# Altium footprint library 4.30-KF-5.08连接器.PcbLib: 153 footprints (part 7 of 10)
Each footprint in its own frame and in the unit in brackets; x right, y up, seen from the top. Pads: shape width x height; smd on the part's side, far side on the other; paste and mask are expansions set on the pad; w line width, h text height; cw(c..) or ccw(c..) is an arc to the next point about the centre after c.
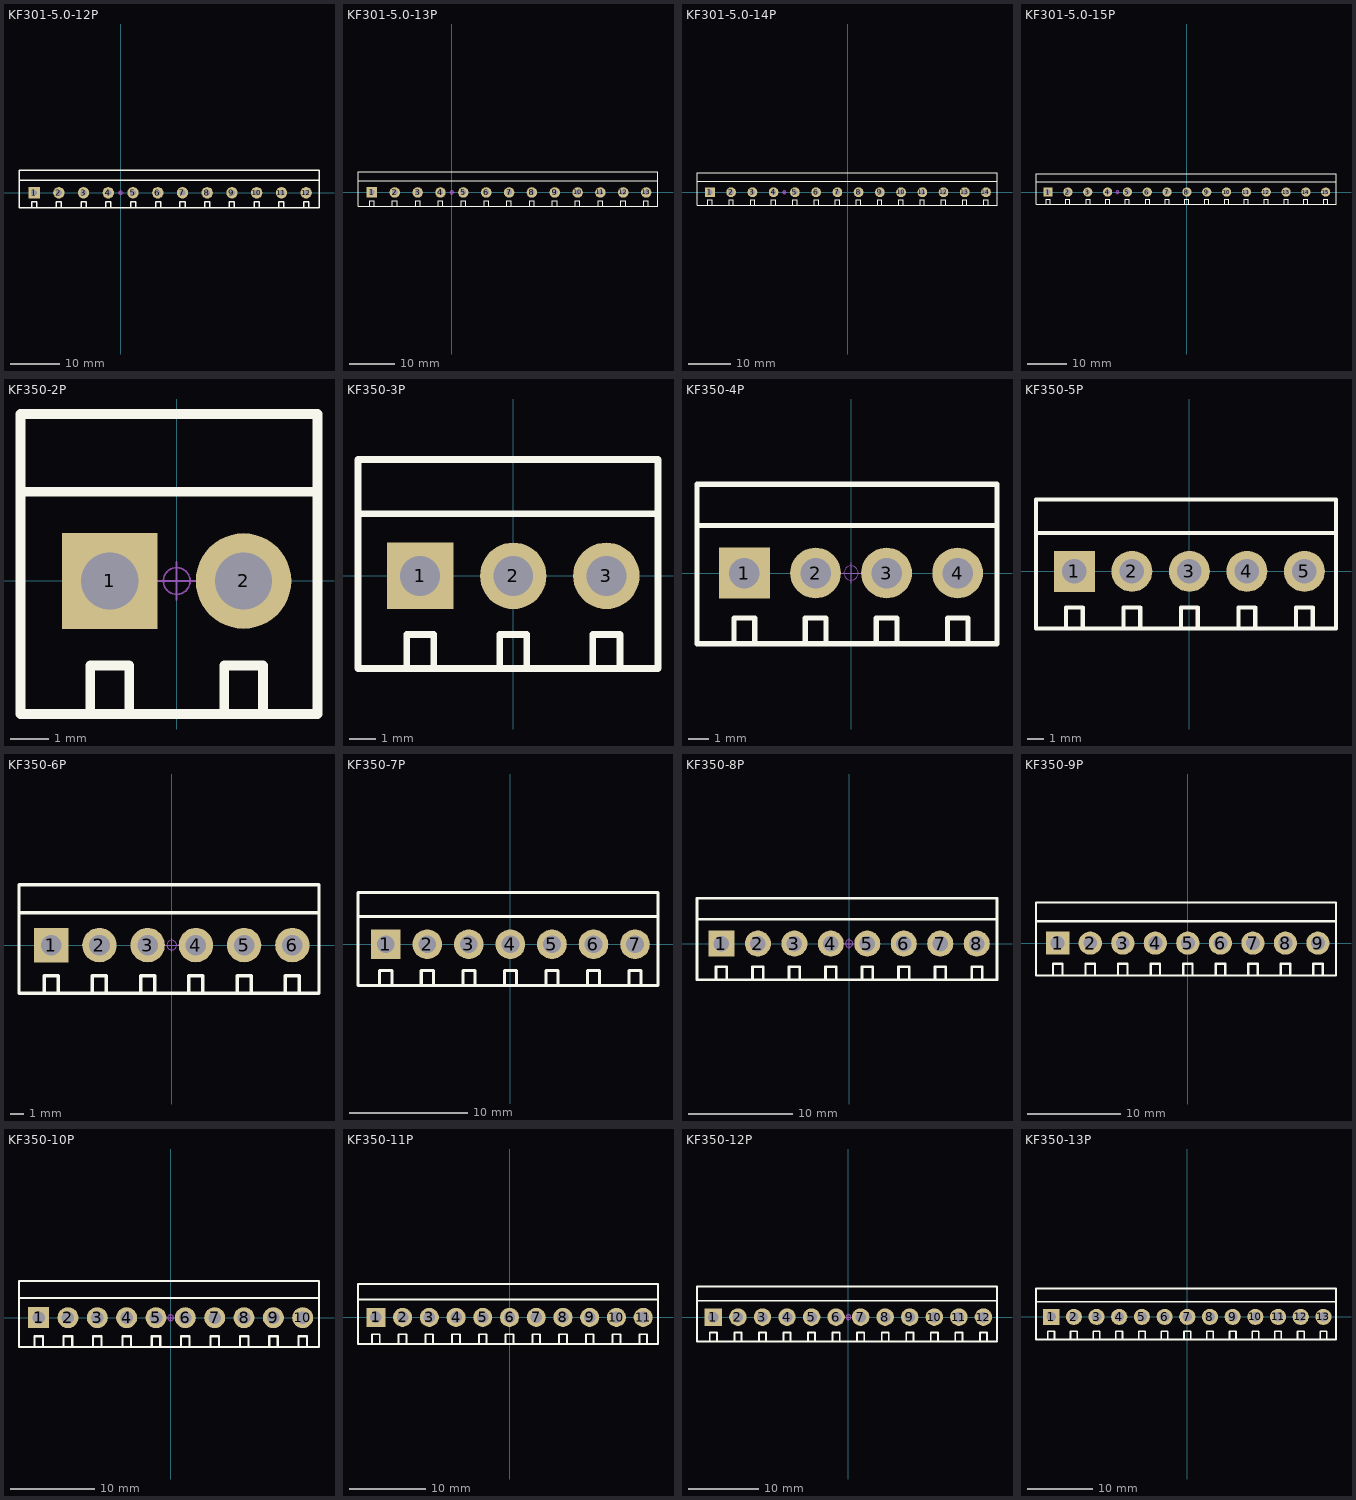
[diagram p6: the footprints below, top view; thin cyan lines are the x and y axes]

## KF301-5.0-12P [mm] "可拼接端子/6A      [ PCB学习群514746572 ]"
pads (12):
  rect 2.3x2.3 hole 1.2: 1(-17.5,0)
  round 2.3 hole 1.2: 2(-12.5,0) 3(-7.5,0) 4(-2.5,0) 5(2.5,0) 6(7.5,0) 7(12.5,0) 8(17.5,0) 9(22.5,0) 10(27.5,0) 11(32.5,0) 12(37.5,0)
Top Overlay:
  lines w0.254: -20.548,2.54 20.092,2.54 25.052,2.54 ; -18.008,-3.048 -18.008,-1.778 -16.992,-1.778 -16.992,-3.048 ; -13.008,-3.048 -13.008,-1.778 -11.992,-1.778 -11.992,-3.048 ; -7.928,-3.048 -7.928,-1.778 -6.912,-1.778 -6.912,-3.048 ; -3.008,-3.048 -3.008,-1.778 -1.992,-1.778 -1.992,-3.048 ; 1.992,-3.048 1.992,-1.778 3.008,-1.778 3.008,-3.048 ; 7.072,-3.048 7.072,-1.778 8.088,-1.778 8.088,-3.048 ; 11.992,-3.048 11.992,-1.778 13.008,-1.778 13.008,-3.048 ; 16.992,-3.048 16.992,-1.778 18.008,-1.778 18.008,-3.048 ; 21.992,-3.048 21.992,-1.778 23.008,-1.778 23.008,-3.048 ; 25.092,2.54 30.052,2.54 ; 26.992,-3.048 26.992,-1.778 28.008,-1.778 28.008,-3.048 ; 30.092,2.54 35.052,2.54 ; 31.992,-3.048 31.992,-1.778 33.008,-1.778 33.008,-3.048 ; 35.092,2.54 40.052,2.54 ; 36.992,-3.048 36.992,-1.778 38.008,-1.778 38.008,-3.048 ; -20.548,-3.048 -20.548,4.572 20.092,4.572 25.092,4.572 30.092,4.572 35.092,4.572 40.092,4.572 40.092,-3.048 35.092,-3.048 30.092,-3.048 25.092,-3.048 20.092,-3.048 -20.548,-3.048
Mechanical 15:
  circle w0.05: c0,0 r0.35
  lines w0.05: -0.5,0 0.5,0 ; 0,-0.5 0,0.5
3D body "KF301.STEP": height 3.29, standoff -10.51, extent -20.45,-3 -14.95,4.6
3D body "KF301.STEP": height 3.29, standoff -10.51, extent -15.45,-3 -9.95,4.6
3D body "KF301.STEP": height 3.29, standoff -10.51, extent -10.45,-3 -4.95,4.6
3D body "KF301.STEP": height 3.29, standoff -10.51, extent -5.45,-3 0.05,4.6
3D body "KF301.STEP": height 3.29, standoff -10.51, extent -0.45,-3 5.05,4.6
3D body "KF301.STEP": height 3.29, standoff -10.51, extent 4.55,-3 10.05,4.6
3D body "KF301.STEP": height 3.29, standoff -10.51, extent 9.55,-3 15.05,4.6
3D body "KF301.STEP": height 3.29, standoff -10.51, extent 14.55,-3 20.05,4.6
3D body "KF301.STEP": height 3.29, standoff -10.51, extent 19.55,-3 25.05,4.6
3D body "KF301.STEP": height 3.29, standoff -10.51, extent 24.55,-3 30.05,4.6
3D body "KF301.STEP": height 3.29, standoff -10.51, extent 29.55,-3 35.05,4.6
3D body "KF301.STEP": height 3.29, standoff -10.51, extent 34.55,-3 40.05,4.6

## KF301-5.0-13P [mm] "可拼接端子/6A      [ PCB学习群514746572 ]"
pads (13):
  rect 2.3x2.3 hole 1.2: 1(-17.5,0)
  round 2.3 hole 1.2: 2(-12.5,0) 3(-7.5,0) 4(-2.5,0) 5(2.5,0) 6(7.5,0) 7(12.5,0) 8(17.5,0) 9(22.5,0) 10(27.5,0) 11(32.5,0) 12(37.5,0) 13(42.5,0)
Top Overlay:
  lines w0.254: -20.548,2.54 20.092,2.54 25.052,2.54 ; -18.008,-3.048 -18.008,-1.778 -16.992,-1.778 -16.992,-3.048 ; -13.008,-3.048 -13.008,-1.778 -11.992,-1.778 -11.992,-3.048 ; -7.928,-3.048 -7.928,-1.778 -6.912,-1.778 -6.912,-3.048 ; -3.008,-3.048 -3.008,-1.778 -1.992,-1.778 -1.992,-3.048 ; 1.992,-3.048 1.992,-1.778 3.008,-1.778 3.008,-3.048 ; 7.072,-3.048 7.072,-1.778 8.088,-1.778 8.088,-3.048 ; 11.992,-3.048 11.992,-1.778 13.008,-1.778 13.008,-3.048 ; 16.992,-3.048 16.992,-1.778 18.008,-1.778 18.008,-3.048 ; 21.992,-3.048 21.992,-1.778 23.008,-1.778 23.008,-3.048 ; 25.092,2.54 30.052,2.54 ; 26.992,-3.048 26.992,-1.778 28.008,-1.778 28.008,-3.048 ; 30.092,2.54 35.052,2.54 ; 31.992,-3.048 31.992,-1.778 33.008,-1.778 33.008,-3.048 ; 35.092,2.54 40.052,2.54 ; 36.992,-3.048 36.992,-1.778 38.008,-1.778 38.008,-3.048 ; 40.092,2.54 45.052,2.54 ; 41.992,-3.048 41.992,-1.778 43.008,-1.778 43.008,-3.048 ; -20.548,-3.048 20.092,-3.048 25.092,-3.048 30.092,-3.048 35.092,-3.048 40.092,-3.048 45.092,-3.048 45.092,4.572 40.092,4.572 35.092,4.572 30.092,4.572 25.092,4.572 20.092,4.572 -20.548,4.572 -20.548,-3.048
Mechanical 15:
  circle w0.05: c0,0 r0.35
  lines w0.05: -0.5,0 0.5,0 ; 0,-0.5 0,0.5
3D body "KF301.STEP": height 3.29, standoff -10.51, extent -20.45,-3 -14.95,4.6
3D body "KF301.STEP": height 3.29, standoff -10.51, extent -15.45,-3 -9.95,4.6
3D body "KF301.STEP": height 3.29, standoff -10.51, extent -10.45,-3 -4.95,4.6
3D body "KF301.STEP": height 3.29, standoff -10.51, extent -5.45,-3 0.05,4.6
3D body "KF301.STEP": height 3.29, standoff -10.51, extent -0.45,-3 5.05,4.6
3D body "KF301.STEP": height 3.29, standoff -10.51, extent 4.55,-3 10.05,4.6
3D body "KF301.STEP": height 3.29, standoff -10.51, extent 9.55,-3 15.05,4.6
3D body "KF301.STEP": height 3.29, standoff -10.51, extent 14.55,-3 20.05,4.6
3D body "KF301.STEP": height 3.29, standoff -10.51, extent 19.55,-3 25.05,4.6
3D body "KF301.STEP": height 3.29, standoff -10.51, extent 24.55,-3 30.05,4.6
3D body "KF301.STEP": height 3.29, standoff -10.51, extent 29.55,-3 35.05,4.6
3D body "KF301.STEP": height 3.29, standoff -10.51, extent 34.55,-3 40.05,4.6
3D body "KF301.STEP": height 3.29, standoff -10.51, extent 39.55,-3 45.05,4.6

## KF301-5.0-14P [mm] "可拼接端子/6A      [ PCB学习群514746572 ]"
pads (14):
  rect 2.3x2.3 hole 1.2: 1(-32.5,0)
  round 2.3 hole 1.2: 2(-27.5,0) 3(-22.5,0) 4(-17.5,0) 5(-12.5,0) 6(-7.5,0) 7(-2.5,0) 8(2.5,0) 9(7.5,0) 10(12.5,0) 11(17.5,0) 12(22.5,0) 13(27.5,0) 14(32.5,0)
Top Overlay:
  lines w0.254: -35.548,2.54 5.092,2.54 10.052,2.54 ; -33.008,-3.048 -33.008,-1.778 -31.992,-1.778 -31.992,-3.048 ; -28.008,-3.048 -28.008,-1.778 -26.992,-1.778 -26.992,-3.048 ; -22.928,-3.048 -22.928,-1.778 -21.912,-1.778 -21.912,-3.048 ; -18.008,-3.048 -18.008,-1.778 -16.992,-1.778 -16.992,-3.048 ; -13.008,-3.048 -13.008,-1.778 -11.992,-1.778 -11.992,-3.048 ; -7.928,-3.048 -7.928,-1.778 -6.912,-1.778 -6.912,-3.048 ; -3.008,-3.048 -3.008,-1.778 -1.992,-1.778 -1.992,-3.048 ; 1.992,-3.048 1.992,-1.778 3.008,-1.778 3.008,-3.048 ; 6.992,-3.048 6.992,-1.778 8.008,-1.778 8.008,-3.048 ; 10.092,2.54 15.052,2.54 ; 11.992,-3.048 11.992,-1.778 13.008,-1.778 13.008,-3.048 ; 15.092,2.54 20.052,2.54 ; 16.992,-3.048 16.992,-1.778 18.008,-1.778 18.008,-3.048 ; 20.092,2.54 25.052,2.54 ; 21.992,-3.048 21.992,-1.778 23.008,-1.778 23.008,-3.048 ; 25.092,2.54 30.052,2.54 ; 26.992,-3.048 26.992,-1.778 28.008,-1.778 28.008,-3.048 ; 30.092,2.54 35.052,2.54 ; 31.992,-3.048 31.992,-1.778 33.008,-1.778 33.008,-3.048 ; -35.548,-3.048 -35.548,4.572 5.092,4.572 10.092,4.572 15.092,4.572 20.092,4.572 25.092,4.572 30.092,4.572 35.092,4.572 35.092,-3.048 30.092,-3.048 25.092,-3.048 20.092,-3.048 15.092,-3.048 10.092,-3.048 5.092,-3.048 -35.548,-3.048
Mechanical 15:
  circle w0.05: c-15,0 r0.35
  lines w0.05: -15.5,0 -14.5,0 ; -15,-0.5 -15,0.5
3D body "KF301.STEP": height 3.29, standoff -10.51, extent -35.45,-3 -29.95,4.6
3D body "KF301.STEP": height 3.29, standoff -10.51, extent -30.45,-3 -24.95,4.6
3D body "KF301.STEP": height 3.29, standoff -10.51, extent -25.45,-3 -19.95,4.6
3D body "KF301.STEP": height 3.29, standoff -10.51, extent -20.45,-3 -14.95,4.6
3D body "KF301.STEP": height 3.29, standoff -10.51, extent -15.45,-3 -9.95,4.6
3D body "KF301.STEP": height 3.29, standoff -10.51, extent -10.45,-3 -4.95,4.6
3D body "KF301.STEP": height 3.29, standoff -10.51, extent -5.45,-3 0.05,4.6
3D body "KF301.STEP": height 3.29, standoff -10.51, extent -0.45,-3 5.05,4.6
3D body "KF301.STEP": height 3.29, standoff -10.51, extent 4.55,-3 10.05,4.6
3D body "KF301.STEP": height 3.29, standoff -10.51, extent 9.55,-3 15.05,4.6
3D body "KF301.STEP": height 3.29, standoff -10.51, extent 14.55,-3 20.05,4.6
3D body "KF301.STEP": height 3.29, standoff -10.51, extent 19.55,-3 25.05,4.6
3D body "KF301.STEP": height 3.29, standoff -10.51, extent 24.55,-3 30.05,4.6
3D body "KF301.STEP": height 3.29, standoff -10.51, extent 29.55,-3 35.05,4.6

## KF301-5.0-15P [mm] "可拼接端子/6A      [ PCB学习群514746572 ]"
pads (15):
  rect 2.3x2.3 hole 1.2: 1(-35,0)
  round 2.3 hole 1.2: 2(-30,0) 3(-25,0) 4(-20,0) 5(-15,0) 6(-10,0) 7(-5,0) 8(0,0) 9(5,0) 10(10,0) 11(15,0) 12(20,0) 13(25,0) 14(30,0) 15(35,0)
Top Overlay:
  lines w0.254: -38.048,2.54 2.592,2.54 7.552,2.54 ; -35.508,-3.048 -35.508,-1.778 -34.492,-1.778 -34.492,-3.048 ; -30.508,-3.048 -30.508,-1.778 -29.492,-1.778 -29.492,-3.048 ; -25.428,-3.048 -25.428,-1.778 -24.412,-1.778 -24.412,-3.048 ; -20.508,-3.048 -20.508,-1.778 -19.492,-1.778 -19.492,-3.048 ; -15.508,-3.048 -15.508,-1.778 -14.492,-1.778 -14.492,-3.048 ; -10.428,-3.048 -10.428,-1.778 -9.412,-1.778 -9.412,-3.048 ; -5.508,-3.048 -5.508,-1.778 -4.492,-1.778 -4.492,-3.048 ; -0.508,-3.048 -0.508,-1.778 0.508,-1.778 0.508,-3.048 ; 4.492,-3.048 4.492,-1.778 5.508,-1.778 5.508,-3.048 ; 7.592,2.54 12.552,2.54 ; 9.492,-3.048 9.492,-1.778 10.508,-1.778 10.508,-3.048 ; 12.592,2.54 17.552,2.54 ; 14.492,-3.048 14.492,-1.778 15.508,-1.778 15.508,-3.048 ; 17.592,2.54 22.552,2.54 ; 19.492,-3.048 19.492,-1.778 20.508,-1.778 20.508,-3.048 ; 22.592,2.54 27.552,2.54 ; 24.492,-3.048 24.492,-1.778 25.508,-1.778 25.508,-3.048 ; 27.592,2.54 32.552,2.54 ; 29.492,-3.048 29.492,-1.778 30.508,-1.778 30.508,-3.048 ; 32.592,2.54 37.552,2.54 ; 34.492,-3.048 34.492,-1.778 35.508,-1.778 35.508,-3.048 ; -38.048,-3.048 -38.048,4.572 2.592,4.572 7.592,4.572 12.592,4.572 17.592,4.572 22.592,4.572 27.592,4.572 32.592,4.572 37.592,4.572 37.592,-3.048 32.592,-3.048 27.592,-3.048 22.592,-3.048 17.592,-3.048 12.592,-3.048 7.592,-3.048 2.592,-3.048 -38.048,-3.048
Mechanical 15:
  circle w0.05: c-17.5,0 r0.35
  lines w0.05: -18,0 -17,0 ; -17.5,-0.5 -17.5,0.5
3D body "KF301.STEP": height 3.29, standoff -10.51, extent 32.05,-3 37.55,4.6
3D body "KF301.STEP": height 3.29, standoff -10.51, extent 27.05,-3 32.55,4.6
3D body "KF301.STEP": height 3.29, standoff -10.51, extent 22.05,-3 27.55,4.6
3D body "KF301.STEP": height 3.29, standoff -10.51, extent 17.05,-3 22.55,4.6
3D body "KF301.STEP": height 3.29, standoff -10.51, extent 12.05,-3 17.55,4.6
3D body "KF301.STEP": height 3.29, standoff -10.51, extent 7.05,-3 12.55,4.6
3D body "KF301.STEP": height 3.29, standoff -10.51, extent 2.05,-3 7.55,4.6
3D body "KF301.STEP": height 3.29, standoff -10.51, extent -2.95,-3 2.55,4.6
3D body "KF301.STEP": height 3.29, standoff -10.51, extent -7.95,-3 -2.45,4.6
3D body "KF301.STEP": height 3.29, standoff -10.51, extent -12.95,-3 -7.45,4.6
3D body "KF301.STEP": height 3.29, standoff -10.51, extent -17.95,-3 -12.45,4.6
3D body "KF301.STEP": height 3.29, standoff -10.51, extent -22.95,-3 -17.45,4.6
3D body "KF301.STEP": height 3.29, standoff -10.51, extent -27.95,-3 -22.45,4.6
3D body "KF301.STEP": height 3.29, standoff -10.51, extent -32.95,-3 -27.45,4.6
3D body "KF301.STEP": height 3.29, standoff -10.51, extent -37.95,-3 -32.45,4.6

## KF350-2P [mm] "可拼接端子/10A      [ PCB学习群514746572 ]"
pads (2):
  rect 2.5x2.5 hole 1.5: 1(-1.75,0)
  round 2.5 hole 1.5: 2(1.75,0)
Top Overlay:
  lines w0.254: -4.087,2.337 3.686,2.337 ; -2.258,-3.48 -2.258,-2.21 -1.242,-2.21 -1.242,-3.48 ; 1.242,-3.48 1.242,-2.21 2.258,-2.21 2.258,-3.48 ; -4.087,-3.48 -4.087,4.369 3.686,4.369 3.686,-3.48 -4.087,-3.48
Mechanical 15:
  circle w0.05: c0,0 r0.35
  lines w0.05: -0.5,0 0.5,0 ; 0,-0.5 0,0.5
3D body "KF350.STEP": height 10.1, standoff -3.7, extent -0.4,-3.3 3.5,4.2
3D body "KF350.STEP": height 10.1, standoff -3.7, extent -3.9,-3.3 0,4.2

## KF350-3P [mm] "可拼接端子/10A      [ PCB学习群514746572 ]"
pads (3):
  rect 2.5x2.5 hole 1.5: 1(-3.5,0)
  round 2.5 hole 1.5: 2(0,0) 3(3.5,0)
Top Overlay:
  lines w0.254: -5.837,2.337 5.441,2.337 ; -4.008,-3.48 -4.008,-2.21 -2.992,-2.21 -2.992,-3.48 ; -0.508,-3.48 -0.508,-2.21 0.508,-2.21 0.508,-3.48 ; 2.992,-3.48 2.992,-2.21 4.008,-2.21 4.008,-3.48 ; -5.837,-3.48 5.441,-3.48 5.441,4.369 -5.837,4.369 -5.837,-3.48
Mechanical 15:
  circle w0.05: c0,0 r0.35
  lines w0.05: -0.5,0 0.5,0 ; 0,-0.5 0,0.5
3D body "KF350.STEP": height 10.1, standoff -3.7, extent -5.65,-3.3 -1.75,4.2
3D body "KF350.STEP": height 10.1, standoff -3.7, extent -2.15,-3.3 1.75,4.2
3D body "KF350.STEP": height 10.1, standoff -3.7, extent 1.35,-3.3 5.25,4.2

## KF350-4P [mm] "可拼接端子/10A      [ PCB学习群514746572 ]"
pads (4):
  rect 2.5x2.5 hole 1.5: 1(-5.25,0)
  round 2.5 hole 1.5: 2(-1.75,0) 3(1.75,0) 4(5.25,0)
Top Overlay:
  lines w0.254: -7.587,2.337 7.186,2.337 ; -5.758,-3.48 -5.758,-2.21 -4.742,-2.21 -4.742,-3.48 ; -2.258,-3.48 -2.258,-2.21 -1.242,-2.21 -1.242,-3.48 ; 1.242,-3.48 1.242,-2.21 2.258,-2.21 2.258,-3.48 ; 4.742,-3.48 4.742,-2.21 5.758,-2.21 5.758,-3.48 ; -7.587,-3.48 7.186,-3.48 7.186,4.369 -7.587,4.369 -7.587,-3.48
Mechanical 15:
  circle w0.05: c0,0 r0.35
  lines w0.05: -0.5,0 0.5,0 ; 0,-0.5 0,0.5
3D body "KF350.STEP": height 10.1, standoff -3.7, extent -7.4,-3.3 -3.5,4.2
3D body "KF350.STEP": height 10.1, standoff -3.7, extent -3.9,-3.3 0,4.2
3D body "KF350.STEP": height 10.1, standoff -3.7, extent -0.4,-3.3 3.5,4.2
3D body "KF350.STEP": height 10.1, standoff -3.7, extent 3.1,-3.3 7,4.2

## KF350-5P [mm] "可拼接端子/10A      [ PCB学习群514746572 ]"
pads (5):
  rect 2.5x2.5 hole 1.5: 1(-7,0)
  round 2.5 hole 1.5: 2(-3.5,0) 3(0,0) 4(3.5,0) 5(7,0)
Top Overlay:
  lines w0.254: -9.337,2.337 8.926,2.337 ; -7.508,-3.48 -7.508,-2.21 -6.492,-2.21 -6.492,-3.48 ; -4.008,-3.48 -4.008,-2.21 -2.992,-2.21 -2.992,-3.48 ; -0.508,-3.48 -0.508,-2.21 0.508,-2.21 0.508,-3.48 ; 2.992,-3.48 2.992,-2.21 4.008,-2.21 4.008,-3.48 ; 6.492,-3.48 6.492,-2.21 7.508,-2.21 7.508,-3.48 ; -9.337,-3.48 -9.337,4.369 8.926,4.369 8.926,-3.48 -9.337,-3.48
Mechanical 15:
  circle w0.05: c0,0 r0.35
  lines w0.05: -0.5,0 0.5,0 ; 0,-0.5 0,0.5
3D body "KF350.STEP": height 10.1, standoff -3.7, extent -9.15,-3.3 -5.25,4.2
3D body "KF350.STEP": height 10.1, standoff -3.7, extent -5.65,-3.3 -1.75,4.2
3D body "KF350.STEP": height 10.1, standoff -3.7, extent -2.15,-3.3 1.75,4.2
3D body "KF350.STEP": height 10.1, standoff -3.7, extent 1.35,-3.3 5.25,4.2
3D body "KF350.STEP": height 10.1, standoff -3.7, extent 4.85,-3.3 8.75,4.2

## KF350-6P [mm] "可拼接端子/10A      [ PCB学习群514746572 ]"
pads (6):
  rect 2.5x2.5 hole 1.5: 1(-8.75,0)
  round 2.5 hole 1.5: 2(-5.25,0) 3(-1.75,0) 4(1.75,0) 5(5.25,0) 6(8.75,0)
Top Overlay:
  lines w0.254: -11.087,2.337 10.66,2.337 ; -9.258,-3.48 -9.258,-2.21 -8.242,-2.21 -8.242,-3.48 ; -5.758,-3.48 -5.758,-2.21 -4.742,-2.21 -4.742,-3.48 ; -2.258,-3.48 -2.258,-2.21 -1.242,-2.21 -1.242,-3.48 ; 1.242,-3.48 1.242,-2.21 2.258,-2.21 2.258,-3.48 ; 4.742,-3.48 4.742,-2.21 5.758,-2.21 5.758,-3.48 ; 8.243,-3.48 8.243,-2.21 9.259,-2.21 9.259,-3.48 ; -11.087,-3.48 10.686,-3.48 10.686,4.369 -11.087,4.369 -11.087,-3.48
Mechanical 15:
  circle w0.05: c0,0 r0.35
  lines w0.05: -0.5,0 0.5,0 ; 0,-0.5 0,0.5
3D body "KF350.STEP": height 10.1, standoff -3.7, extent -10.9,-3.3 -7,4.2
3D body "KF350.STEP": height 10.1, standoff -3.7, extent -7.4,-3.3 -3.5,4.2
3D body "KF350.STEP": height 10.1, standoff -3.7, extent -3.9,-3.3 0,4.2
3D body "KF350.STEP": height 10.1, standoff -3.7, extent -0.4,-3.3 3.5,4.2
3D body "KF350.STEP": height 10.1, standoff -3.7, extent 3.1,-3.3 7,4.2
3D body "KF350.STEP": height 10.1, standoff -3.7, extent 6.6,-3.3 10.5,4.2

## KF350-7P [mm] "可拼接端子/10A      [ PCB学习群514746572 ]"
pads (7):
  rect 2.5x2.5 hole 1.5: 1(-10.5,0)
  round 2.5 hole 1.5: 2(-7,0) 3(-3.5,0) 4(0,0) 5(3.5,0) 6(7,0) 7(10.5,0)
Top Overlay:
  lines w0.254: -12.837,2.337 12.436,2.337 ; -11.008,-3.48 -11.008,-2.21 -9.992,-2.21 -9.992,-3.48 ; -7.508,-3.48 -7.508,-2.21 -6.492,-2.21 -6.492,-3.48 ; -4.008,-3.48 -4.008,-2.21 -2.992,-2.21 -2.992,-3.48 ; -0.508,-3.48 -0.508,-2.21 0.508,-2.21 0.508,-3.48 ; 2.992,-3.48 2.992,-2.21 4.008,-2.21 4.008,-3.48 ; 6.493,-3.48 6.493,-2.21 7.509,-2.21 7.509,-3.48 ; 9.998,-3.48 9.998,-2.21 11.014,-2.21 11.014,-3.48 ; -12.837,-3.48 -12.837,4.369 12.436,4.369 12.436,-3.48 -12.837,-3.48
Mechanical 15:
  circle w0.05: c0,0 r0.35
  lines w0.05: -0.5,0 0.5,0 ; 0,-0.5 0,0.5
3D body "KF350.STEP": height 10.1, standoff -3.7, extent -12.65,-3.3 -8.75,4.2
3D body "KF350.STEP": height 10.1, standoff -3.7, extent -9.15,-3.3 -5.25,4.2
3D body "KF350.STEP": height 10.1, standoff -3.7, extent -5.65,-3.3 -1.75,4.2
3D body "KF350.STEP": height 10.1, standoff -3.7, extent -2.15,-3.3 1.75,4.2
3D body "KF350.STEP": height 10.1, standoff -3.7, extent 1.35,-3.3 5.25,4.2
3D body "KF350.STEP": height 10.1, standoff -3.7, extent 4.85,-3.3 8.75,4.2
3D body "KF350.STEP": height 10.1, standoff -3.7, extent 8.35,-3.3 12.25,4.2

## KF350-8P [mm] "可拼接端子/10A      [ PCB学习群514746572 ]"
pads (8):
  rect 2.5x2.5 hole 1.5: 1(-12.25,0)
  round 2.5 hole 1.5: 2(-8.75,0) 3(-5.25,0) 4(-1.75,0) 5(1.75,0) 6(5.25,0) 7(8.75,0) 8(12.25,0)
Top Overlay:
  lines w0.254: -14.587,2.337 14.191,2.337 ; -12.758,-3.48 -12.758,-2.21 -11.742,-2.21 -11.742,-3.48 ; -9.258,-3.48 -9.258,-2.21 -8.242,-2.21 -8.242,-3.48 ; -5.758,-3.48 -5.758,-2.21 -4.742,-2.21 -4.742,-3.48 ; -2.258,-3.48 -2.258,-2.21 -1.242,-2.21 -1.242,-3.48 ; 1.242,-3.48 1.242,-2.21 2.258,-2.21 2.258,-3.48 ; 4.743,-3.48 4.743,-2.21 5.759,-2.21 5.759,-3.48 ; 8.248,-3.48 8.248,-2.21 9.264,-2.21 9.264,-3.48 ; 11.753,-3.48 11.753,-2.21 12.769,-2.21 12.769,-3.48 ; -14.587,-3.48 -14.587,4.369 14.191,4.369 14.191,-3.48 -14.587,-3.48
Mechanical 15:
  circle w0.05: c0,0 r0.35
  lines w0.05: -0.5,0 0.5,0 ; 0,-0.5 0,0.5
3D body "KF350.STEP": height 10.1, standoff -3.7, extent -14.4,-3.3 -10.5,4.2
3D body "KF350.STEP": height 10.1, standoff -3.7, extent -10.9,-3.3 -7,4.2
3D body "KF350.STEP": height 10.1, standoff -3.7, extent -7.4,-3.3 -3.5,4.2
3D body "KF350.STEP": height 10.1, standoff -3.7, extent -3.9,-3.3 0,4.2
3D body "KF350.STEP": height 10.1, standoff -3.7, extent -0.4,-3.3 3.5,4.2
3D body "KF350.STEP": height 10.1, standoff -3.7, extent 3.1,-3.3 7,4.2
3D body "KF350.STEP": height 10.1, standoff -3.7, extent 6.6,-3.3 10.5,4.2
3D body "KF350.STEP": height 10.1, standoff -3.7, extent 10.1,-3.3 14,4.2

## KF350-9P [mm] "可拼接端子/10A      [ PCB学习群514746572 ]"
pads (9):
  rect 2.5x2.5 hole 1.5: 1(-14,0)
  round 2.5 hole 1.5: 2(-10.5,0) 3(-7,0) 4(-3.5,0) 5(0,0) 6(3.5,0) 7(7,0) 8(10.5,0) 9(14,0)
Top Overlay:
  lines w0.254: -16.337,2.337 12.441,2.337 15.903,2.337 ; -14.508,-3.48 -14.508,-2.21 -13.492,-2.21 -13.492,-3.48 ; -11.008,-3.48 -11.008,-2.21 -9.992,-2.21 -9.992,-3.48 ; -7.508,-3.48 -7.508,-2.21 -6.492,-2.21 -6.492,-3.48 ; -4.008,-3.48 -4.008,-2.21 -2.992,-2.21 -2.992,-3.48 ; -0.508,-3.48 -0.508,-2.21 0.508,-2.21 0.508,-3.48 ; 2.993,-3.48 2.993,-2.21 4.009,-2.21 4.009,-3.48 ; 6.498,-3.48 6.498,-2.21 7.514,-2.21 7.514,-3.48 ; 10.003,-3.48 10.003,-2.21 11.019,-2.21 11.019,-3.48 ; 13.503,-3.48 13.503,-2.21 14.519,-2.21 14.519,-3.48 ; -16.337,-3.48 -16.337,4.369 12.441,4.369 15.941,4.369 15.941,-3.48 12.441,-3.48 -16.337,-3.48
Mechanical 15:
  circle w0.05: c0,0 r0.35
  lines w0.05: -0.5,0 0.5,0 ; 0,-0.5 0,0.5
3D body "KF350.STEP": height 10.1, standoff -3.7, extent -16.15,-3.3 -12.25,4.2
3D body "KF350.STEP": height 10.1, standoff -3.7, extent -12.65,-3.3 -8.75,4.2
3D body "KF350.STEP": height 10.1, standoff -3.7, extent -9.15,-3.3 -5.25,4.2
3D body "KF350.STEP": height 10.1, standoff -3.7, extent -5.65,-3.3 -1.75,4.2
3D body "KF350.STEP": height 10.1, standoff -3.7, extent -2.15,-3.3 1.75,4.2
3D body "KF350.STEP": height 10.1, standoff -3.7, extent 1.35,-3.3 5.25,4.2
3D body "KF350.STEP": height 10.1, standoff -3.7, extent 4.85,-3.3 8.75,4.2
3D body "KF350.STEP": height 10.1, standoff -3.7, extent 8.35,-3.3 12.25,4.2
3D body "KF350.STEP": height 10.1, standoff -3.7, extent 11.85,-3.3 15.75,4.2

## KF350-10P [mm] "可拼接端子/10A      [ PCB学习群514746572 ]"
pads (10):
  rect 2.5x2.5 hole 1.5: 1(-15.75,0)
  round 2.5 hole 1.5: 2(-12.25,0) 3(-8.75,0) 4(-5.25,0) 5(-1.75,0) 6(1.75,0) 7(5.25,0) 8(8.75,0) 9(12.25,0) 10(15.75,0)
Top Overlay:
  lines w0.254: -18.087,2.337 10.691,2.337 14.153,2.337 ; -16.258,-3.48 -16.258,-2.21 -15.242,-2.21 -15.242,-3.48 ; -12.758,-3.48 -12.758,-2.21 -11.742,-2.21 -11.742,-3.48 ; -9.258,-3.48 -9.258,-2.21 -8.242,-2.21 -8.242,-3.48 ; -5.758,-3.48 -5.758,-2.21 -4.742,-2.21 -4.742,-3.48 ; -2.258,-3.48 -2.258,-2.21 -1.242,-2.21 -1.242,-3.48 ; 1.243,-3.48 1.243,-2.21 2.259,-2.21 2.259,-3.48 ; 4.748,-3.48 4.748,-2.21 5.764,-2.21 5.764,-3.48 ; 8.253,-3.48 8.253,-2.21 9.269,-2.21 9.269,-3.48 ; 11.753,-3.48 11.753,-2.21 12.769,-2.21 12.769,-3.48 ; 14.191,2.337 17.653,2.337 ; 15.253,-3.48 15.253,-2.21 16.269,-2.21 16.269,-3.48 ; -18.087,-3.48 -18.087,4.369 10.691,4.369 14.191,4.369 17.691,4.369 17.691,-3.48 14.191,-3.48 10.691,-3.48 -18.087,-3.48
Mechanical 15:
  circle w0.05: c0,0 r0.35
  lines w0.05: -0.5,0 0.5,0 ; 0,-0.5 0,0.5
3D body "KF350.STEP": height 10.1, standoff -3.7, extent 13.6,-3.3 17.5,4.2
3D body "KF350.STEP": height 10.1, standoff -3.7, extent 10.1,-3.3 14,4.2
3D body "KF350.STEP": height 10.1, standoff -3.7, extent 6.6,-3.3 10.5,4.2
3D body "KF350.STEP": height 10.1, standoff -3.7, extent 3.1,-3.3 7,4.2
3D body "KF350.STEP": height 10.1, standoff -3.7, extent -0.4,-3.3 3.5,4.2
3D body "KF350.STEP": height 10.1, standoff -3.7, extent -3.9,-3.3 0,4.2
3D body "KF350.STEP": height 10.1, standoff -3.7, extent -7.4,-3.3 -3.5,4.2
3D body "KF350.STEP": height 10.1, standoff -3.7, extent -10.9,-3.3 -7,4.2
3D body "KF350.STEP": height 10.1, standoff -3.7, extent -14.4,-3.3 -10.5,4.2
3D body "KF350.STEP": height 10.1, standoff -3.7, extent -17.9,-3.3 -14,4.2

## KF350-11P [mm] "可拼接端子/10A      [ PCB学习群514746572 ]"
pads (11):
  rect 2.5x2.5 hole 1.5: 1(-17.5,0)
  round 2.5 hole 1.5: 2(-14,0) 3(-10.5,0) 4(-7,0) 5(-3.5,0) 6(0,0) 7(3.5,0) 8(7,0) 9(10.5,0) 10(14,0) 11(17.5,0)
Top Overlay:
  lines w0.254: -19.837,2.337 8.941,2.337 12.403,2.337 ; -18.008,-3.48 -18.008,-2.21 -16.992,-2.21 -16.992,-3.48 ; -14.508,-3.48 -14.508,-2.21 -13.492,-2.21 -13.492,-3.48 ; -11.008,-3.48 -11.008,-2.21 -9.992,-2.21 -9.992,-3.48 ; -7.508,-3.48 -7.508,-2.21 -6.492,-2.21 -6.492,-3.48 ; -4.008,-3.48 -4.008,-2.21 -2.992,-2.21 -2.992,-3.48 ; -0.507,-3.48 -0.507,-2.21 0.509,-2.21 0.509,-3.48 ; 2.998,-3.48 2.998,-2.21 4.014,-2.21 4.014,-3.48 ; 6.503,-3.48 6.503,-2.21 7.519,-2.21 7.519,-3.48 ; 10.003,-3.48 10.003,-2.21 11.019,-2.21 11.019,-3.48 ; 12.441,2.337 15.903,2.337 ; 13.503,-3.48 13.503,-2.21 14.519,-2.21 14.519,-3.48 ; 15.941,2.337 19.403,2.337 ; 17.003,-3.48 17.003,-2.21 18.019,-2.21 18.019,-3.48 ; -19.837,-3.48 8.941,-3.48 12.441,-3.48 15.941,-3.48 19.441,-3.48 19.441,4.369 15.941,4.369 12.441,4.369 8.941,4.369 -19.837,4.369 -19.837,-3.48
Mechanical 15:
  circle w0.05: c0,0 r0.35
  lines w0.05: -0.5,0 0.5,0 ; 0,-0.5 0,0.5
3D body "KF350.STEP": height 10.1, standoff -3.7, extent -19.65,-3.3 -15.75,4.2
3D body "KF350.STEP": height 10.1, standoff -3.7, extent -16.15,-3.3 -12.25,4.2
3D body "KF350.STEP": height 10.1, standoff -3.7, extent -12.65,-3.3 -8.75,4.2
3D body "KF350.STEP": height 10.1, standoff -3.7, extent -9.15,-3.3 -5.25,4.2
3D body "KF350.STEP": height 10.1, standoff -3.7, extent -5.65,-3.3 -1.75,4.2
3D body "KF350.STEP": height 10.1, standoff -3.7, extent -2.15,-3.3 1.75,4.2
3D body "KF350.STEP": height 10.1, standoff -3.7, extent 1.35,-3.3 5.25,4.2
3D body "KF350.STEP": height 10.1, standoff -3.7, extent 4.85,-3.3 8.75,4.2
3D body "KF350.STEP": height 10.1, standoff -3.7, extent 8.35,-3.3 12.25,4.2
3D body "KF350.STEP": height 10.1, standoff -3.7, extent 11.85,-3.3 15.75,4.2
3D body "KF350.STEP": height 10.1, standoff -3.7, extent 15.35,-3.3 19.25,4.2

## KF350-12P [mm] "可拼接端子/10A      [ PCB学习群514746572 ]"
pads (12):
  rect 2.5x2.5 hole 1.5: 1(-19.25,0)
  round 2.5 hole 1.5: 2(-15.75,0) 3(-12.25,0) 4(-8.75,0) 5(-5.25,0) 6(-1.75,0) 7(1.75,0) 8(5.25,0) 9(8.75,0) 10(12.25,0) 11(15.75,0) 12(19.25,0)
Top Overlay:
  lines w0.254: -21.587,2.337 7.191,2.337 10.653,2.337 ; -19.758,-3.48 -19.758,-2.21 -18.742,-2.21 -18.742,-3.48 ; -16.258,-3.48 -16.258,-2.21 -15.242,-2.21 -15.242,-3.48 ; -12.758,-3.48 -12.758,-2.21 -11.742,-2.21 -11.742,-3.48 ; -9.258,-3.48 -9.258,-2.21 -8.242,-2.21 -8.242,-3.48 ; -5.758,-3.48 -5.758,-2.21 -4.742,-2.21 -4.742,-3.48 ; -2.257,-3.48 -2.257,-2.21 -1.241,-2.21 -1.241,-3.48 ; 1.248,-3.48 1.248,-2.21 2.264,-2.21 2.264,-3.48 ; 4.753,-3.48 4.753,-2.21 5.769,-2.21 5.769,-3.48 ; 8.253,-3.48 8.253,-2.21 9.269,-2.21 9.269,-3.48 ; 10.691,2.337 14.153,2.337 ; 11.753,-3.48 11.753,-2.21 12.769,-2.21 12.769,-3.48 ; 14.191,2.337 17.653,2.337 ; 15.253,-3.48 15.253,-2.21 16.269,-2.21 16.269,-3.48 ; 17.691,2.337 21.153,2.337 ; 18.753,-3.48 18.753,-2.21 19.769,-2.21 19.769,-3.48 ; 21.191,-3.48 17.691,-3.48 14.191,-3.48 10.691,-3.48 7.191,-3.48 -21.587,-3.48 -21.587,4.369 7.191,4.369 10.691,4.369 14.191,4.369 17.691,4.369 21.191,4.369 21.191,-3.309
Mechanical 15:
  circle w0.05: c0,0 r0.35
  lines w0.05: -0.5,0 0.5,0 ; 0,-0.5 0,0.5
3D body "KF350.STEP": height 10.1, standoff -3.7, extent -21.4,-3.3 -17.5,4.2
3D body "KF350.STEP": height 10.1, standoff -3.7, extent -17.9,-3.3 -14,4.2
3D body "KF350.STEP": height 10.1, standoff -3.7, extent -14.4,-3.3 -10.5,4.2
3D body "KF350.STEP": height 10.1, standoff -3.7, extent -10.9,-3.3 -7,4.2
3D body "KF350.STEP": height 10.1, standoff -3.7, extent -7.4,-3.3 -3.5,4.2
3D body "KF350.STEP": height 10.1, standoff -3.7, extent -3.9,-3.3 0,4.2
3D body "KF350.STEP": height 10.1, standoff -3.7, extent -0.4,-3.3 3.5,4.2
3D body "KF350.STEP": height 10.1, standoff -3.7, extent 3.1,-3.3 7,4.2
3D body "KF350.STEP": height 10.1, standoff -3.7, extent 6.6,-3.3 10.5,4.2
3D body "KF350.STEP": height 10.1, standoff -3.7, extent 10.1,-3.3 14,4.2
3D body "KF350.STEP": height 10.1, standoff -3.7, extent 13.6,-3.3 17.5,4.2
3D body "KF350.STEP": height 10.1, standoff -3.7, extent 17.1,-3.3 21,4.2

## KF350-13P [mm] "可拼接端子/10A      [ PCB学习群514746572 ]"
pads (13):
  rect 2.5x2.5 hole 1.5: 1(-21,0)
  round 2.5 hole 1.5: 2(-17.5,0) 3(-14,0) 4(-10.5,0) 5(-7,0) 6(-3.5,0) 7(0,0) 8(3.5,0) 9(7,0) 10(10.5,0) 11(14,0) 12(17.5,0) 13(21,0)
Top Overlay:
  lines w0.254: -23.337,2.337 5.441,2.337 8.903,2.337 ; -21.508,-3.48 -21.508,-2.21 -20.492,-2.21 -20.492,-3.48 ; -18.008,-3.48 -18.008,-2.21 -16.992,-2.21 -16.992,-3.48 ; -14.508,-3.48 -14.508,-2.21 -13.492,-2.21 -13.492,-3.48 ; -11.008,-3.48 -11.008,-2.21 -9.992,-2.21 -9.992,-3.48 ; -7.508,-3.48 -7.508,-2.21 -6.492,-2.21 -6.492,-3.48 ; -4.007,-3.48 -4.007,-2.21 -2.991,-2.21 -2.991,-3.48 ; -0.502,-3.48 -0.502,-2.21 0.514,-2.21 0.514,-3.48 ; 3.003,-3.48 3.003,-2.21 4.019,-2.21 4.019,-3.48 ; 6.503,-3.48 6.503,-2.21 7.519,-2.21 7.519,-3.48 ; 8.941,2.337 12.403,2.337 ; 10.003,-3.48 10.003,-2.21 11.019,-2.21 11.019,-3.48 ; 12.441,2.337 15.903,2.337 ; 13.503,-3.48 13.503,-2.21 14.519,-2.21 14.519,-3.48 ; 15.941,2.337 19.403,2.337 ; 17.003,-3.48 17.003,-2.21 18.019,-2.21 18.019,-3.48 ; 19.441,2.337 22.903,2.337 ; 20.503,-3.48 20.503,-2.21 21.519,-2.21 21.519,-3.48 ; -23.337,-3.48 -23.337,4.369 5.441,4.369 8.941,4.369 12.441,4.369 15.941,4.369 19.441,4.369 22.941,4.369 22.941,-3.48 19.441,-3.48 15.941,-3.48 12.441,-3.48 8.941,-3.48 5.441,-3.48 -23.337,-3.48
Mechanical 15:
  circle w0.05: c0,0 r0.35
  lines w0.05: -0.5,0 0.5,0 ; 0,-0.5 0,0.5
3D body "KF350.STEP": height 10.1, standoff -3.7, extent -23.15,-3.3 -19.25,4.2
3D body "KF350.STEP": height 10.1, standoff -3.7, extent -19.65,-3.3 -15.75,4.2
3D body "KF350.STEP": height 10.1, standoff -3.7, extent -16.15,-3.3 -12.25,4.2
3D body "KF350.STEP": height 10.1, standoff -3.7, extent -12.65,-3.3 -8.75,4.2
3D body "KF350.STEP": height 10.1, standoff -3.7, extent -9.15,-3.3 -5.25,4.2
3D body "KF350.STEP": height 10.1, standoff -3.7, extent -5.65,-3.3 -1.75,4.2
3D body "KF350.STEP": height 10.1, standoff -3.7, extent -2.15,-3.3 1.75,4.2
3D body "KF350.STEP": height 10.1, standoff -3.7, extent 1.35,-3.3 5.25,4.2
3D body "KF350.STEP": height 10.1, standoff -3.7, extent 4.85,-3.3 8.75,4.2
3D body "KF350.STEP": height 10.1, standoff -3.7, extent 8.35,-3.3 12.25,4.2
3D body "KF350.STEP": height 10.1, standoff -3.7, extent 11.85,-3.3 15.75,4.2
3D body "KF350.STEP": height 10.1, standoff -3.7, extent 15.35,-3.3 19.25,4.2
3D body "KF350.STEP": height 10.1, standoff -3.7, extent 18.85,-3.3 22.75,4.2